# Altium footprint library MyPcbLib.PcbLib: 657 footprints (part 33 of 42)
Each footprint in its own frame and in the unit in brackets; x right, y up, seen from the top. Pads: shape width x height; smd on the part's side, far side on the other; paste and mask are expansions set on the pad; w line width, h text height; cw(c..) or ccw(c..) is an arc to the next point about the centre after c.
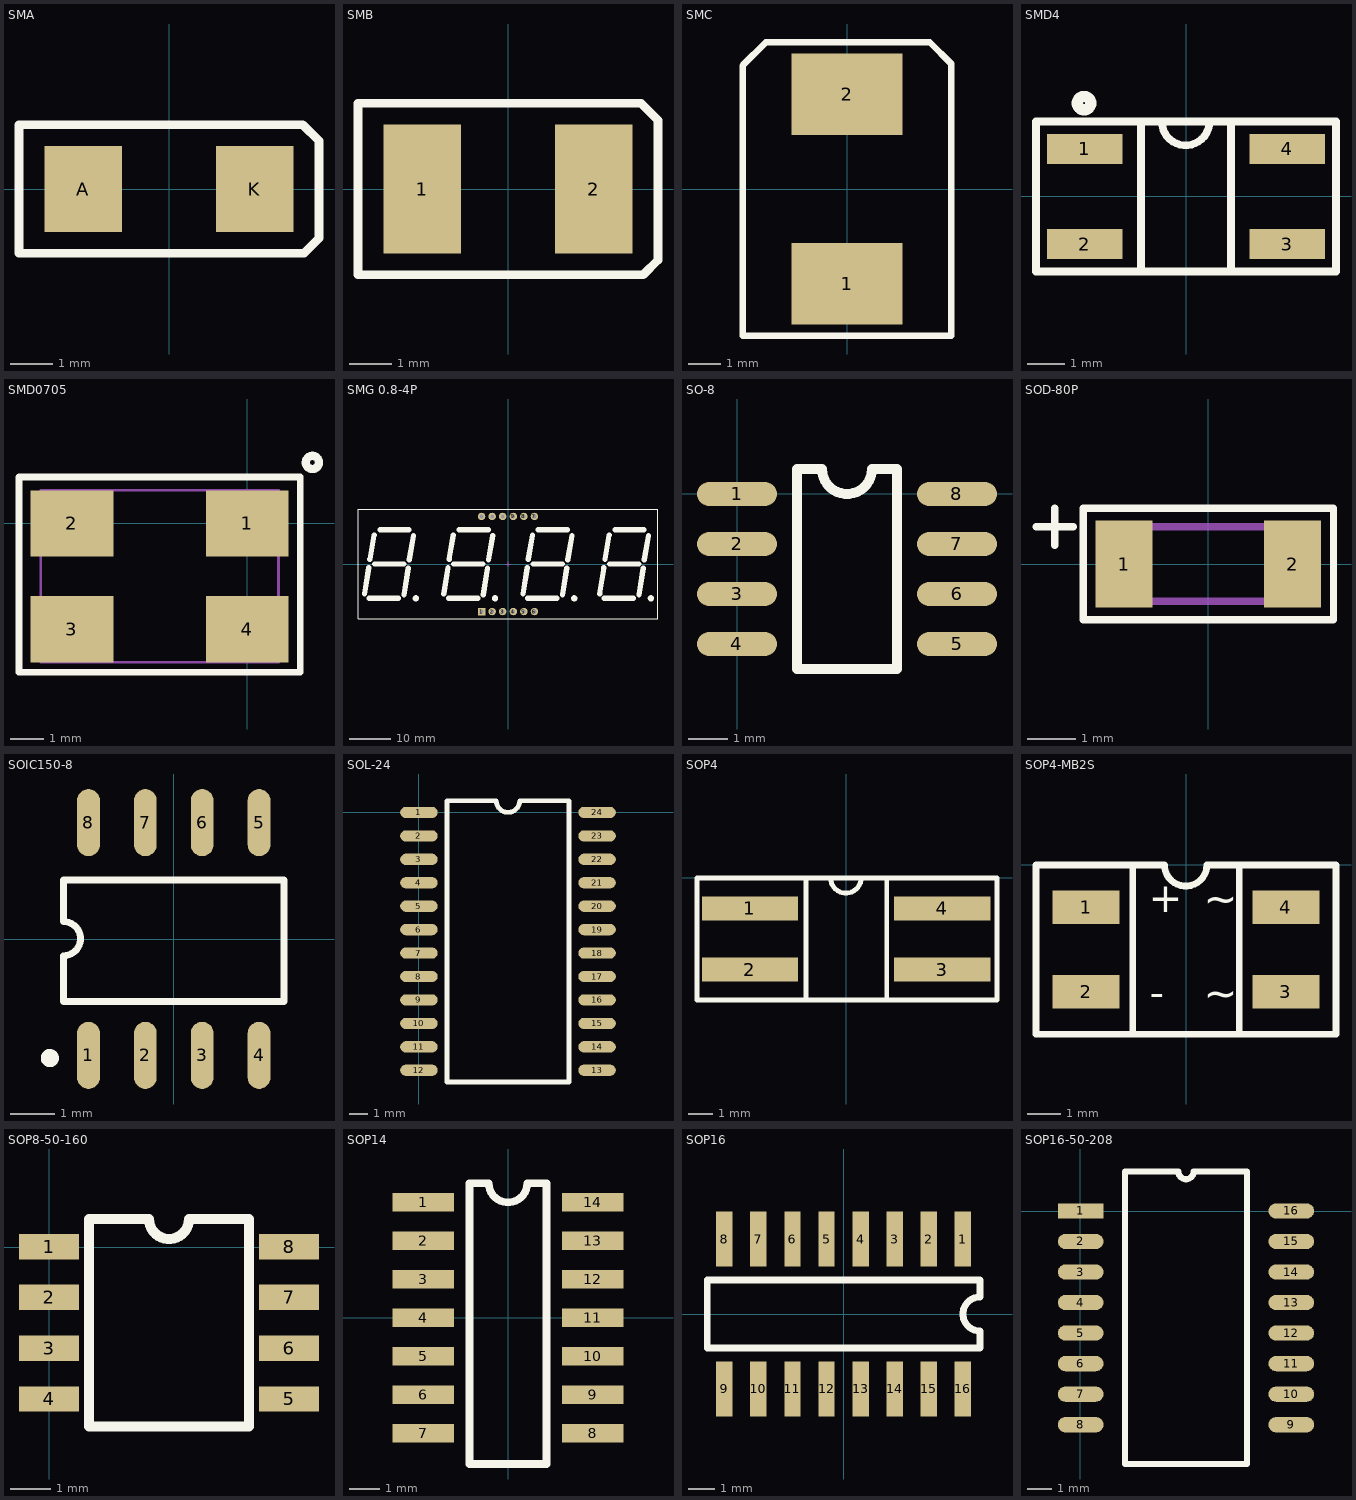
[diagram p32: the footprints below, top view; thin cyan lines are the x and y axes]

## SMA [mm]
pads (2):
  rect 1.8x2 smd: A(-2,0) K(2,0)
Top Overlay:
  lines w0.203: -3.5,-1.5 3.148,-1.5 3.5,-1.148 3.5,1.123 3.123,1.5 -3.5,1.5 -3.5,-1.5

## SMB [mm]
pads (2):
  rect 1.8x3 smd: 1(-2,0) 2(2,0)
Top Overlay:
  lines w0.203: -3.5,-2 3.156,-2 3.5,-1.656 3.5,1.605 3.105,2 -3.5,2 -3.5,-2

## SMC [mm]
pads (2):
  rect 3.4x2.5 smd: 1(0,-2.9) 2(0,2.9)
Top Overlay:
  lines w0.203: -3.2,-4.5 3.2,-4.5 3.2,3.836 2.536,4.5 -2.485,4.5 -3.2,3.785 -3.2,-4.5
3D body: height 2.67, standoff 0.03, extent -3.149,-4.013 3.15,4.115

## SMD4 [mm]
pads (4):
  rect 2x0.8 smd: 1(-2.7,1.27) 2(-2.7,-1.27) 3(2.7,-1.27) 4(2.7,1.27)
Top Overlay:
  circle w0.3: c-2.718,2.489 r0.18
  lines w0.203: -1.2,-2 -1.2,2 ; 0.626,2 cw(c-0.009,2) -0.644,2 ; 1.2,-2 1.2,2 ; -0.644,2 -4,2 -4,-2 4,-2 4,2 -0.644,2

## SMD0705 [mm]
pads (4):
  rect 2.5x2 smd: 1(0,0) 2(-5.3,0) 3(-5.3,-3.2) 4(0,-3.2)
Top Overlay:
  lines w0.203: -6.9,-4.5 1.6,-4.5 1.6,1.4 -6.9,1.4 -6.9,-4.5
  lines w0.25: 1.97,2.042 ccw(c1.97,1.842) 2.032,2.032
Mechanical 1:
  lines w0.076: -6.246,-4.205 0.946,-4.205 0.946,1.005 -6.246,1.005 -6.246,-4.205

## SMG 0.8-4P [mm] "59.2*27.7*10mm(长宽厚)"
pads (12):
  rect 1.8x1.8 hole 0.9: 1(-6.35,-11.43)
  round 1.8 hole 0.9: 2(-3.81,-11.43) 3(-1.27,-11.43) 4(1.27,-11.43) 5(3.81,-11.43) 6(6.35,-11.43) 7(6.35,11.43) 8(3.81,11.43) 9(1.27,11.43) 10(-1.27,11.43) 11(-3.81,11.43) 12(-6.35,11.43)
Top Overlay:
  circle w0.762: c34.353,-8.255 r0.381
  circle w0.762: c-22.162,-8.255 r0.381
  circle w0.762: c-3.111,-8.255 r0.381
  circle w0.762: c15.938,-8.255 r0.381
  lines w0.254: -36.068,-13.208 -36.068,13.208 36.068,13.208 36.068,-13.208 -36.068,-13.208
  lines w1.27: -34.48,-7.239 -33.465,-0.889 ; -33.337,-8.255 -26.352,-8.255 ; -33.21,1.143 -32.194,6.985 ; -32.067,0 -25.082,0 ; -30.797,8.255 -23.812,8.255 ; -25.001,-7.366 -23.985,-1.016 ; -23.731,1.016 -22.715,6.858 ; -15.43,-7.239 -14.414,-0.889 ; -14.287,-8.255 -7.302,-8.255 ; -14.16,1.143 -13.144,6.985 ; -13.018,0 -6.032,0 ; -11.747,8.255 -4.763,8.255 ; -5.951,-7.366 -4.935,-1.016 ; -4.681,1.016 -3.665,6.858 ; 3.619,-7.239 4.635,-0.889 ; 4.763,-8.255 11.747,-8.255 ; 4.889,1.143 5.905,6.985 ; 6.032,0 13.018,0 ; 7.302,8.255 14.287,8.255 ; 13.099,-7.366 14.115,-1.016 ; 14.369,1.016 15.385,6.858 ; 22.034,-7.239 23.05,-0.889 ; 23.177,-8.255 30.162,-8.255 ; 23.304,1.143 24.32,6.985 ; 24.447,0 31.432,0 ; 25.717,8.255 32.703,8.255 ; 31.514,-7.366 32.53,-1.016 ; 32.784,1.016 33.8,6.858
Mechanical 15:
  lines w0.1: -0.508,0 0.508,0 ; 0,-0.508 0,0.508
3D body: height 10, standoff -3.1, extent -35.8,-13 35.8,13

## SO-8 [mil]
pads (8):
  oval 80x24 smd: 1(0,0) 2(0,-50) 3(0,-100) 4(0,-150) 5(220,-150) 6(220,-100) 7(220,-50) 8(220,0)
Top Overlay:
  lines w10: 60,-175 60,25 85,25 ccw(c110,25) 135,25 160,25 160,-175 60,-175

## SOD-80P [mil]
pads (2):
  rect 46x70 smd: 1(-68.05,0.32) 2(67.95,0.32)
Top Overlay:
  lines w6: -139.05,30.32 -109.05,30.32 ; -124.05,15.32 -124.05,45.32 ; -101.05,-44.68 100.95,-44.68 100.95,45.32 -101.05,45.32 -101.05,-44.68
Mechanical 1:
  lines w6: -70.05,-29.68 69.95,-29.68 69.95,30.32 -70.05,30.32 -70.05,-29.68

## SOIC150-8 [mm]
pads (8):
  oval 0.508x1.5 smd: 1(-1.906,-2.6) 2(-0.636,-2.6) 3(0.634,-2.6) 4(1.904,-2.6) 5(1.904,2.6) 6(0.634,2.6) 7(-0.636,2.6) 8(-1.906,2.6)
Top Overlay:
  circle w0.203: c-2.77,-2.659 r0.1
  lines w0.152: -2.465,-1.397 -2.465,-0.373 ccw(c-2.465,0.008) -2.465,0.389 -2.465,1.321 2.462,1.321 2.462,-1.397 -2.465,-1.397
3D body: height 1.7, standoff 0, extent -2.45,-3 2.45,3

## SOL-24 [mil]
pads (24):
  oval 80x24 smd: 1(0,0) 2(0,-50) 3(0,-100) 4(0,-150) 5(0,-200) 6(0,-250) 7(0,-300) 8(0,-350) 9(0,-400) 10(0,-450) 11(0,-500) 12(0,-550) 13(380,-550) 14(380,-500) 15(380,-450) 16(380,-400) 17(380,-350) 18(380,-300) 19(380,-250) 20(380,-200) 21(380,-150) 22(380,-100) 23(380,-50) 24(380,0)
Top Overlay:
  lines w10: 60,-575 320,-575 320,25 215,25 cw(c190,25) 165,25 60,25 60,-575
3D body: height 114.17, standoff 2.6, extent -19.66,-585.81 397.66,26

## SOP4 [mm]
pads (4):
  rect 4x1 smd: 1(-4,-1.277) 2(-4,-3.817) 3(4,-3.817) 4(4,-1.277)
Top Overlay:
  lines w0.203: -1.66,-5.087 -1.66,-0.007 ; 0.626,-0.007 cw(c-0.009,-0.007) -0.644,-0.007 ; 1.693,-5.062 1.693,-0.025 ; -0.644,-0.007 6.274,-0.007 6.274,-5.087 -6.198,-5.087 -6.198,-0.007 -0.644,-0.007

## SOP4-MB2S [mm] "MB2S"
pads (4):
  rect 2x1 smd: 1(-3,-1.277) 2(-3,-3.817) 3(3,-3.817) 4(3,-1.277)
Top Overlay:
  lines w0.203: -1.6,-5.087 -1.6,-0.007 ; 0.626,-0.007 cw(c-0.009,-0.007) -0.644,-0.007 -4.5,-0.007 -4.5,-5.087 4.5,-5.087 4.5,-0.007 0.644,-0.007 ; 1.6,-5.062 1.6,-0.025
  text "~" at 0.533,-4.597 h1.52
  text "~" at 0.533,-1.753 h1.52
  text "+" at -1.118,-1.727 h1.52
  text "-" at -1.092,-4.547 h1.52

## SOP8-50-160 [mm]
pads (8):
  rect 1.5x0.635 smd: 1(-0.006,0.012) 2(-0.006,-1.258) 3(-0.006,-2.528) 4(-0.006,-3.798) 5(5.994,-3.798) 6(5.994,-2.528) 7(5.994,-1.258) 8(5.994,0.012)
Top Overlay:
  lines w0.254: 0.994,-4.488 0.994,0.702 2.494,0.702 ccw(c2.994,0.702) 3.494,0.702 4.994,0.702 4.994,-4.488 0.994,-4.488
3D body: height 1.7, standoff 0, extent -0.003,-4.355 5.997,0.545

## SOP14 [mil]
pads (14):
  rect 80x24 smd: 1(-110,150) 2(-110,100) 3(-110,50) 4(-110,0) 5(-110,-50) 6(-110,-100) 7(-110,-150) 8(110,-150) 9(110,-100) 10(110,-50) 11(110,0) 12(110,50) 13(110,100) 14(110,150)
Top Overlay:
  lines w10: -50,-190 50,-190 50,175 25,175 cw(c0,175) -25,175 -50,175 -50,-190

## SOP16 [mil]
pads (16):
  rect 24x80 smd: 1(175,110) 2(125,110) 3(75,110) 4(25,110) 5(-25,110) 6(-75,110) 7(-125,110) 8(-175,110) 9(-175,-110) 10(-125,-110) 11(-75,-110) 12(-25,-110) 13(25,-110) 14(75,-110) 15(125,-110) 16(175,-110)
Top Overlay:
  lines w10: -200,-50 200,-50 200,-25 cw(c200,0) 200,25 200,50 -200,50 -200,-50
3D body: height 57.09, standoff -2.18, extent -192.91,-115 192.91,113.74

## SOP16-50-208 [mm]
pads (16):
  rect 1.905x0.635 smd: 1(0.011,0.012)
  oval 1.905x0.635 smd: 2(0.011,-1.258) 3(0.011,-2.528) 4(0.011,-3.798) 5(0.011,-5.068) 6(0.011,-6.338) 7(0.011,-7.608) 8(0.011,-8.878) 9(8.774,-8.878) 10(8.774,-7.608) 11(8.774,-6.338) 12(8.774,-5.068) 13(8.774,-3.798) 14(8.774,-2.528) 15(8.774,-1.258) 16(8.774,0.012)
Top Overlay:
  lines w0.254: 1.852,-10.513 6.932,-10.513 6.932,1.647 4.71,1.647 cw(c4.392,1.647) 4.075,1.647 1.852,1.647 1.852,-10.513